# Altium footprint library HW_HOLLAND_NCDM_MONITOR_R1.PcbLib: 472 footprints (part 1 of 30)
Each footprint in its own frame and in the unit in brackets; x right, y up, seen from the top. Pads: shape width x height; smd on the part's side, far side on the other; paste and mask are expansions set on the pad; w line width, h text height; cw(c..) or ccw(c..) is an arc to the next point about the centre after c.
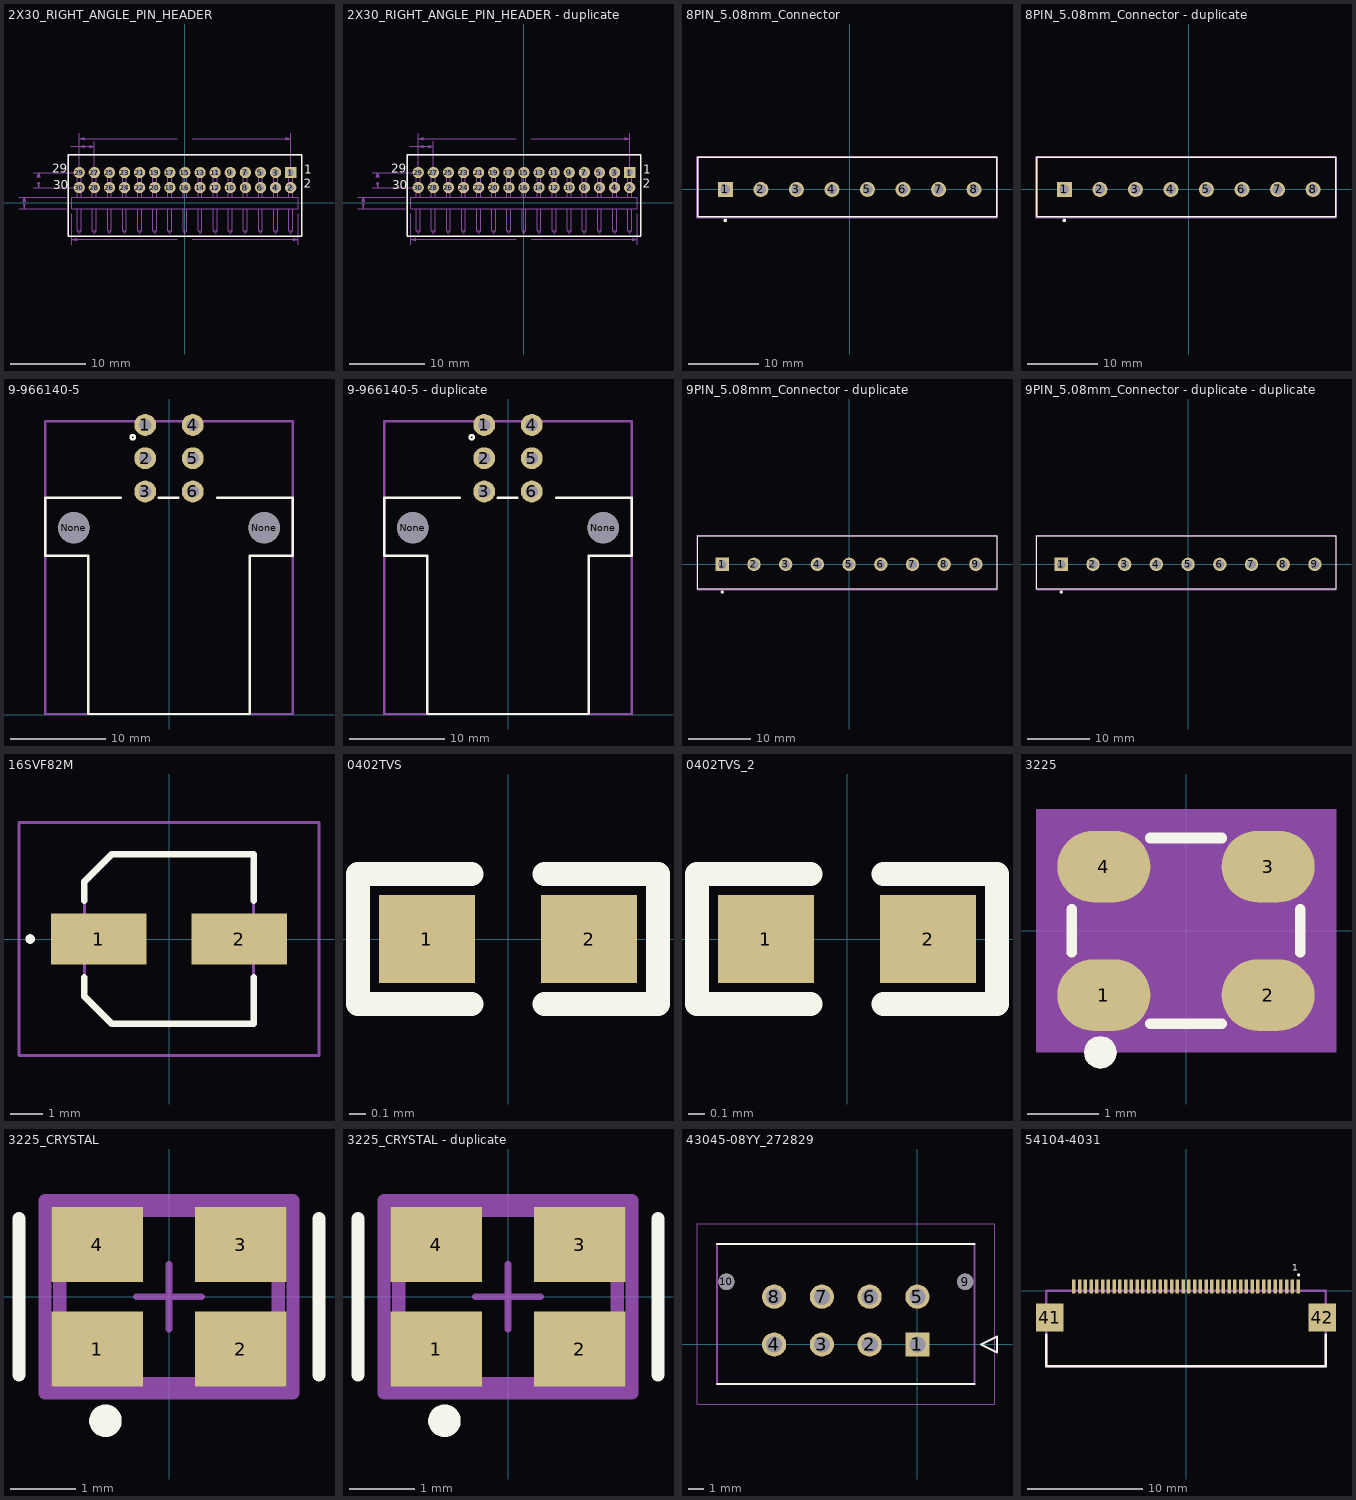
[diagram p0: the footprints below, top view; thin cyan lines are the x and y axes]

## 2X30_RIGHT_ANGLE_PIN_HEADER [mm]
pads (30):
  rect 1.49x1.49 hole 0.89: 1(14,4.019)
  round 1.49 hole 0.89: 2(14,2.019) 3(12,4.019) 4(12,2.019) 5(10,4.019) 6(10,2.019) 7(8,4.019) 8(8,2.019) 9(6,4.019) 10(6,2.019) 11(4,4.019) 12(4,2.019) 13(2,4.019) 14(2,2.019) 15(0,4.019) 16(0,2.019) 17(-2,4.019) 18(-2,2.019) 19(-4,4.019) 20(-4,2.019) 21(-6,4.019) 22(-6,2.019) 23(-8,4.019) 24(-8,2.019) 25(-10,4.019) 26(-10,2.019) 27(-12,4.019) 28(-12,2.019) 29(-14,4.019) 30(-14,2.019)
Top Overlay:
  lines w0.2: -15.45,-4.4 15.45,-4.4 15.45,6.389 -15.45,6.389 -15.45,-4.4
  text "30" at -17.468,1.399 h1.97
  text "29" at -17.568,3.599 h1.97
  text "2" at 15.73,1.584 h1.97
  text "1" at 15.78,3.484 h1.97
Top Solder:
  circle w0: c14,4.019 r0.796
  circle w0: c14,2.019 r0.796
  circle w0: c12,4.019 r0.796
  circle w0: c12,2.019 r0.796
  circle w0: c10,4.019 r0.796
  circle w0: c10,2.019 r0.796
  circle w0: c8,4.019 r0.796
  circle w0: c8,2.019 r0.796
  circle w0: c6,4.019 r0.796
  circle w0: c6,2.019 r0.796
  circle w0: c4,4.019 r0.796
  circle w0: c4,2.019 r0.796
  circle w0: c2,4.019 r0.796
  circle w0: c2,2.019 r0.796
  circle w0: c0,4.019 r0.796
  circle w0: c0,2.019 r0.796
  circle w0: c-2,4.019 r0.796
  circle w0: c-2,2.019 r0.796
  circle w0: c-4,4.019 r0.796
  circle w0: c-4,2.019 r0.796
  circle w0: c-6,4.019 r0.796
  circle w0: c-6,2.019 r0.796
  circle w0: c-8,4.019 r0.796
  circle w0: c-8,2.019 r0.796
  circle w0: c-10,4.019 r0.796
  circle w0: c-10,2.019 r0.796
  circle w0: c-12,4.019 r0.796
  circle w0: c-12,2.019 r0.796
  circle w0: c-14,4.019 r0.796
  circle w0: c-14,2.019 r0.796
Bottom Solder:
  circle w0: c14,4.019 r0.796
  circle w0: c14,2.019 r0.796
  circle w0: c12,4.019 r0.796
  circle w0: c12,2.019 r0.796
  circle w0: c10,4.019 r0.796
  circle w0: c10,2.019 r0.796
  circle w0: c8,4.019 r0.796
  circle w0: c8,2.019 r0.796
  circle w0: c6,4.019 r0.796
  circle w0: c6,2.019 r0.796
  circle w0: c4,4.019 r0.796
  circle w0: c4,2.019 r0.796
  circle w0: c2,4.019 r0.796
  circle w0: c2,2.019 r0.796
  circle w0: c0,4.019 r0.796
  circle w0: c0,2.019 r0.796
  circle w0: c-2,4.019 r0.796
  circle w0: c-2,2.019 r0.796
  circle w0: c-4,4.019 r0.796
  circle w0: c-4,2.019 r0.796
  circle w0: c-6,4.019 r0.796
  circle w0: c-6,2.019 r0.796
  circle w0: c-8,4.019 r0.796
  circle w0: c-8,2.019 r0.796
  circle w0: c-10,4.019 r0.796
  circle w0: c-10,2.019 r0.796
  circle w0: c-12,4.019 r0.796
  circle w0: c-12,2.019 r0.796
  circle w0: c-14,4.019 r0.796
  circle w0: c-14,2.019 r0.796
Mechanical 16:
  drawing of 196 lines, arcs and shapes, not listed
  text "30" at -17.468,1.399 h1.97
  text "29" at -17.568,3.599 h1.97
  text "2" at 15.73,1.584 h1.97
  text "1" at 15.78,3.484 h1.97
Mechanical 40:
  lines w0: -21.974,-0.762 -15.687,-0.762 ; -21.974,0.762 -15.687,0.762 ; -21.272,-0.318 -21.272,-0.762 ; -21.272,0.318 -21.272,0.762 ; -20.069,2.019 -14.701,2.019 ; -20.069,4.019 -14.701,4.019 ; -19.368,2.73 -19.368,2.019 ; -19.368,3.366 -19.368,4.019 ; -15.151,7.493 -14,7.493 ; -14.986,-5.527 -14.986,-1.463 ; -14,8.194 -14,4.72 -14,9.21 ; -12,4.72 -12,8.194 ; -0.991,-4.826 -14.986,-4.826 ; -0.991,8.509 -14,8.509 ; 0.991,-4.826 14.986,-4.826 ; 0.991,8.509 14,8.509 ; 14,4.72 14,9.21 ; 14.986,-5.527 14.986,-1.463 ; -21.431,-0.127 -21.352,-0.19 -21.272,-0.762 ; -21.431,-0.127 -21.272,-0.254 ; -21.431,-0.127 -21.272,-0.762 ; -21.272,-0.762 -21.272,-0.254 ; -21.272,-0.762 -21.193,-0.19 -21.272,-0.254 ; -21.272,-0.762 -21.114,-0.127 -21.272,-0.254 ; -21.272,0.254 -21.272,0.762 ; -21.272,0.254 -21.352,0.19 -21.272,0.762 ; -21.272,0.254 -21.114,0.127 ; -21.272,0.254 -21.431,0.127 -21.272,0.762 ; -21.272,0.762 -21.193,0.19 -21.114,0.127 ; -21.272,0.762 -21.114,0.127 ; -19.526,2.654 -19.447,2.591 -19.368,2.019 ; -19.526,2.654 -19.368,2.527 ; -19.526,2.654 -19.368,2.019 ; -19.368,2.019 -19.368,2.527 ; -19.368,2.019 -19.288,2.591 -19.368,2.527 ; -19.368,2.019 -19.209,2.654 -19.368,2.527 ; -19.368,3.511 -19.368,4.019 ; -19.368,3.511 -19.447,3.448 -19.368,4.019 ; -19.368,3.511 -19.209,3.384 ; -19.368,3.511 -19.526,3.384 -19.368,4.019 ; -19.368,4.019 -19.288,3.448 -19.209,3.384 ; -19.368,4.019 -19.209,3.384 ; -14.986,-4.826 -14.414,-4.747 -14.351,-4.667 ; -14.986,-4.826 -14.478,-4.826 ; -14.986,-4.826 -14.414,-4.905 -14.478,-4.826 ; -14.986,-4.826 -14.351,-4.985 -14.478,-4.826 ; -14.986,-4.826 -14.351,-4.667 ; -14.478,-4.826 -14.351,-4.667 ; -14,7.493 -12,7.493 ; -14,7.493 -13.428,7.572 -13.365,7.652 ; -14,7.493 -13.492,7.493 ; -14,7.493 -13.428,7.414 -13.492,7.493 ; -14,7.493 -13.365,7.334 -13.492,7.493 ; -14,7.493 -13.365,7.652 ; -14,8.509 -13.428,8.588 -13.365,8.668 ; -14,8.509 -13.492,8.509 ; -14,8.509 -13.428,8.43 -13.492,8.509 ; -14,8.509 -13.365,8.35 -13.492,8.509 ; -14,8.509 -13.365,8.668 ; -13.492,7.493 -13.365,7.652 ; -13.492,8.509 -13.365,8.668 ; -12.635,7.334 -12.571,7.414 -12,7.493 ; -12.635,7.334 -12.508,7.493 ; -12.635,7.334 -12,7.493 ; -12.508,7.493 -12,7.493 ; -12.508,7.493 -12.571,7.572 -12,7.493 ; -12.508,7.493 -12.635,7.652 -12,7.493 ; 13.365,8.35 13.428,8.43 14,8.509 ; 13.365,8.35 13.492,8.509 ; 13.365,8.35 14,8.509 ; 13.492,8.509 14,8.509 ; 13.492,8.509 13.428,8.588 14,8.509 ; 13.492,8.509 13.365,8.668 14,8.509 ; 14.351,-4.985 14.414,-4.905 14.986,-4.826 ; 14.351,-4.985 14.478,-4.826 ; 14.351,-4.985 14.986,-4.826 ; 14.478,-4.826 14.986,-4.826 ; 14.478,-4.826 14.414,-4.747 14.986,-4.826 ; 14.478,-4.826 14.351,-4.667 14.986,-4.826
  text "28.000" at -0.8,8.382 h0.39
  text "29.972" at -0.8,-4.953 h0.39
  text "2.000" at -16.662,7.366 h0.39
  text "2.000" at -20.028,2.921 h0.39
  text "1.524" at -21.933,-0.127 h0.39
Mechanical 42:
  lines w0.1: -15.45,-4.4 15.45,-4.4 15.45,6.389 -15.45,6.389 -15.45,-4.4
3D body "TMM-115-01-L-D-RA.stp": height 3.97, standoff -3.02, extent -15.05,-3.999 14.95,4.224

## 2X30_RIGHT_ANGLE_PIN_HEADER - duplicate [mm]
pads (30):
  rect 1.49x1.49 hole 0.89: 1(14,4.019)
  round 1.49 hole 0.89: 2(14,2.019) 3(12,4.019) 4(12,2.019) 5(10,4.019) 6(10,2.019) 7(8,4.019) 8(8,2.019) 9(6,4.019) 10(6,2.019) 11(4,4.019) 12(4,2.019) 13(2,4.019) 14(2,2.019) 15(0,4.019) 16(0,2.019) 17(-2,4.019) 18(-2,2.019) 19(-4,4.019) 20(-4,2.019) 21(-6,4.019) 22(-6,2.019) 23(-8,4.019) 24(-8,2.019) 25(-10,4.019) 26(-10,2.019) 27(-12,4.019) 28(-12,2.019) 29(-14,4.019) 30(-14,2.019)
Top Overlay:
  lines w0.2: -15.45,-4.4 -15.45,6.389 15.45,6.389 15.45,-4.4 -15.45,-4.4
  text "1" at 15.78,3.484 h1.97
  text "2" at 15.73,1.584 h1.97
  text "29" at -17.568,3.599 h1.97
  text "30" at -17.468,1.399 h1.97
Top Solder:
  circle w0: c-14,2.019 r0.796
  circle w0: c-14,4.019 r0.796
  circle w0: c-12,2.019 r0.796
  circle w0: c-12,4.019 r0.796
  circle w0: c-10,2.019 r0.796
  circle w0: c-10,4.019 r0.796
  circle w0: c-8,2.019 r0.796
  circle w0: c-8,4.019 r0.796
  circle w0: c-6,2.019 r0.796
  circle w0: c-6,4.019 r0.796
  circle w0: c-4,2.019 r0.796
  circle w0: c-4,4.019 r0.796
  circle w0: c-2,2.019 r0.796
  circle w0: c-2,4.019 r0.796
  circle w0: c0,2.019 r0.796
  circle w0: c0,4.019 r0.796
  circle w0: c2,2.019 r0.796
  circle w0: c2,4.019 r0.796
  circle w0: c4,2.019 r0.796
  circle w0: c4,4.019 r0.796
  circle w0: c6,2.019 r0.796
  circle w0: c6,4.019 r0.796
  circle w0: c8,2.019 r0.796
  circle w0: c8,4.019 r0.796
  circle w0: c10,2.019 r0.796
  circle w0: c10,4.019 r0.796
  circle w0: c12,2.019 r0.796
  circle w0: c12,4.019 r0.796
  circle w0: c14,2.019 r0.796
  circle w0: c14,4.019 r0.796
Bottom Solder:
  circle w0: c-14,2.019 r0.796
  circle w0: c-14,4.019 r0.796
  circle w0: c-12,2.019 r0.796
  circle w0: c-12,4.019 r0.796
  circle w0: c-10,2.019 r0.796
  circle w0: c-10,4.019 r0.796
  circle w0: c-8,2.019 r0.796
  circle w0: c-8,4.019 r0.796
  circle w0: c-6,2.019 r0.796
  circle w0: c-6,4.019 r0.796
  circle w0: c-4,2.019 r0.796
  circle w0: c-4,4.019 r0.796
  circle w0: c-2,2.019 r0.796
  circle w0: c-2,4.019 r0.796
  circle w0: c0,2.019 r0.796
  circle w0: c0,4.019 r0.796
  circle w0: c2,2.019 r0.796
  circle w0: c2,4.019 r0.796
  circle w0: c4,2.019 r0.796
  circle w0: c4,4.019 r0.796
  circle w0: c6,2.019 r0.796
  circle w0: c6,4.019 r0.796
  circle w0: c8,2.019 r0.796
  circle w0: c8,4.019 r0.796
  circle w0: c10,2.019 r0.796
  circle w0: c10,4.019 r0.796
  circle w0: c12,2.019 r0.796
  circle w0: c12,4.019 r0.796
  circle w0: c14,2.019 r0.796
  circle w0: c14,4.019 r0.796
Mechanical 16:
  drawing of 196 lines, arcs and shapes, not listed
  text "1" at 15.78,3.484 h1.97
  text "2" at 15.73,1.584 h1.97
  text "29" at -17.568,3.599 h1.97
  text "30" at -17.468,1.399 h1.97
Mechanical 40:
  lines w0: -21.974,-0.762 -15.687,-0.762 ; -21.974,0.762 -15.687,0.762 ; -21.272,-0.318 -21.272,-0.762 ; -21.272,0.318 -21.272,0.762 ; -20.069,2.019 -14.701,2.019 ; -20.069,4.019 -14.701,4.019 ; -19.368,2.73 -19.368,2.019 ; -19.368,3.366 -19.368,4.019 ; -15.151,7.493 -14,7.493 ; -14.986,-5.527 -14.986,-1.463 ; -14,8.194 -14,4.72 -14,9.21 ; -12,4.72 -12,8.194 ; -0.991,-4.826 -14.986,-4.826 ; -0.991,8.509 -14,8.509 ; 0.991,-4.826 14.986,-4.826 ; 0.991,8.509 14,8.509 ; 14,4.72 14,9.21 ; 14.986,-5.527 14.986,-1.463 ; -21.431,-0.127 -21.272,-0.762 ; -21.431,-0.127 -21.272,-0.254 ; -21.431,-0.127 -21.352,-0.19 -21.272,-0.762 ; -21.272,-0.762 -21.114,-0.127 -21.272,-0.254 ; -21.272,-0.762 -21.193,-0.19 -21.272,-0.254 ; -21.272,-0.762 -21.272,-0.254 ; -21.272,0.254 -21.431,0.127 -21.272,0.762 ; -21.272,0.254 -21.114,0.127 ; -21.272,0.254 -21.352,0.19 -21.272,0.762 ; -21.272,0.254 -21.272,0.762 ; -21.272,0.762 -21.114,0.127 ; -21.272,0.762 -21.193,0.19 -21.114,0.127 ; -19.526,2.654 -19.368,2.019 ; -19.526,2.654 -19.368,2.527 ; -19.526,2.654 -19.447,2.591 -19.368,2.019 ; -19.368,2.019 -19.209,2.654 -19.368,2.527 ; -19.368,2.019 -19.288,2.591 -19.368,2.527 ; -19.368,2.019 -19.368,2.527 ; -19.368,3.511 -19.526,3.384 -19.368,4.019 ; -19.368,3.511 -19.209,3.384 ; -19.368,3.511 -19.447,3.448 -19.368,4.019 ; -19.368,3.511 -19.368,4.019 ; -19.368,4.019 -19.209,3.384 ; -19.368,4.019 -19.288,3.448 -19.209,3.384 ; -14.986,-4.826 -14.351,-4.667 ; -14.986,-4.826 -14.351,-4.985 -14.478,-4.826 ; -14.986,-4.826 -14.414,-4.905 -14.478,-4.826 ; -14.986,-4.826 -14.478,-4.826 ; -14.986,-4.826 -14.414,-4.747 -14.351,-4.667 ; -14.478,-4.826 -14.351,-4.667 ; -14,7.493 -13.365,7.652 ; -14,7.493 -13.365,7.334 -13.492,7.493 ; -14,7.493 -13.428,7.414 -13.492,7.493 ; -14,7.493 -13.492,7.493 ; -14,7.493 -13.428,7.572 -13.365,7.652 ; -14,7.493 -12,7.493 ; -14,8.509 -13.365,8.668 ; -14,8.509 -13.365,8.35 -13.492,8.509 ; -14,8.509 -13.428,8.43 -13.492,8.509 ; -14,8.509 -13.492,8.509 ; -14,8.509 -13.428,8.588 -13.365,8.668 ; -13.492,7.493 -13.365,7.652 ; -13.492,8.509 -13.365,8.668 ; -12.635,7.334 -12,7.493 ; -12.635,7.334 -12.508,7.493 ; -12.635,7.334 -12.571,7.414 -12,7.493 ; -12.508,7.493 -12.635,7.652 -12,7.493 ; -12.508,7.493 -12.571,7.572 -12,7.493 ; -12.508,7.493 -12,7.493 ; 13.365,8.35 14,8.509 ; 13.365,8.35 13.492,8.509 ; 13.365,8.35 13.428,8.43 14,8.509 ; 13.492,8.509 13.365,8.668 14,8.509 ; 13.492,8.509 13.428,8.588 14,8.509 ; 13.492,8.509 14,8.509 ; 14.351,-4.985 14.986,-4.826 ; 14.351,-4.985 14.478,-4.826 ; 14.351,-4.985 14.414,-4.905 14.986,-4.826 ; 14.478,-4.826 14.351,-4.667 14.986,-4.826 ; 14.478,-4.826 14.414,-4.747 14.986,-4.826 ; 14.478,-4.826 14.986,-4.826
  text "1.524" at -21.933,-0.127 h0.39
  text "2.000" at -20.028,2.921 h0.39
  text "2.000" at -16.662,7.366 h0.39
  text "29.972" at -0.8,-4.953 h0.39
  text "28.000" at -0.8,8.382 h0.39
Mechanical 42:
  lines w0.1: -15.45,-4.4 -15.45,6.389 15.45,6.389 15.45,-4.4 -15.45,-4.4
3D body "TMM-115-01-L-D-RA.stp": height 3.97, standoff -3.02, extent -15.05,-3.999 14.95,4.224

## 8PIN_5.08mm_Connector [mm]
pads (8):
  rect 2.15x2.15 hole 1.4 paste-2539.97 mask+0: 1(-17.78,0)
  round 2.15 hole 1.4 paste-2539.97 mask+0: 2(-12.7,0) 3(-7.62,0) 4(-2.54,0) 5(2.54,0) 6(7.62,0) 7(12.7,0) 8(17.78,0)
Top Overlay:
  circle w0.25: c-17.78,-4.425 r0.125
  lines w0.2: -21.73,-3.925 -21.73,4.575 21.035,4.575 21.035,-3.925 -21.73,-3.925
Top Courtyard:
  lines w0.2: -21.83,-4.025 -21.83,4.675 21.035,4.675 21.035,-4.025 -21.83,-4.025
  text ".Designator" at 0.125,1.854 h1
Mechanical 12:
  lines w0.2: -21.73,-3.925 -21.73,4.575 21.035,4.575 21.035,-3.925 -21.73,-3.925
Mechanical 15:
  lines w0.1: -13.45,0.325 -12.45,0.325 ; -12.95,-0.175 -12.95,0.825
  lines w0.2: -21.83,-4.025 -21.83,4.675 21.059,4.675 21.059,-4.025 -21.83,-4.025
3D body "c-796636-8-b-3d.stp": height 12.17, standoff -3.33, extent -21.535,-3.8 20.925,4.55

## 8PIN_5.08mm_Connector - duplicate [mm]
pads (8):
  rect 2.15x2.15 hole 1.4 paste-2539.97 mask+0: 1(-17.78,0)
  round 2.15 hole 1.4 paste-2539.97 mask+0: 2(-12.7,0) 3(-7.62,0) 4(-2.54,0) 5(2.54,0) 6(7.62,0) 7(12.7,0) 8(17.78,0)
Top Overlay:
  circle w0.25: c-17.78,-4.425 r0.125
  lines w0.2: -21.73,-3.925 21.035,-3.925 21.035,4.575 -21.73,4.575 -21.73,-3.925
Top Courtyard:
  lines w0.2: -21.83,-4.025 21.035,-4.025 21.035,4.675 -21.83,4.675 -21.83,-4.025
  text ".Designator" at 0.125,1.854 h1
Mechanical 12:
  lines w0.2: -21.73,-3.925 21.035,-3.925 21.035,4.575 -21.73,4.575 -21.73,-3.925
Mechanical 15:
  lines w0.1: -13.45,0.325 -12.45,0.325 ; -12.95,-0.175 -12.95,0.825
  lines w0.2: -21.83,-4.025 21.059,-4.025 21.059,4.675 -21.83,4.675 -21.83,-4.025
3D body "c-796636-8-b-3d.stp": height 12.17, standoff -3.33, extent -21.535,-3.8 20.925,4.55

## 9-966140-5 [mm]
height 0.52
pads (8):
  round 2.3 hole 1.3 mask+0.05: 1(-2.5,30.5) 2(-2.5,27) 3(-2.5,23.5) 4(2.5,30.5) 5(2.5,27) 6(2.5,23.5)
  round 3.3 hole 3.3 unplated: None(-10,19.7) None(10,19.7)
Top Overlay:
  circle w0.254: c-3.81,29.21 r0.224
  lines w0.254: -5.08,22.85 -13,22.85 -13,16.75 -8.5,16.75 -8.5,0.1 8.5,0.1 8.5,16.75 13,16.75 13,22.85 5.08,22.85 ; -1.1,22.85 1,22.85
Top Designator:
  lines w0.254: -13,0.1 -13,30.9 13,30.9 13,0.1 -13,0.1
  text ".Designator" at -19.994,13.667 h4
3D body "c-9-966140-5-f-3d.stp": height 25.85, standoff -2.85, extent -12.95,0 12.9,30.9

## 9-966140-5 - duplicate [mm]
height 0.52
pads (8):
  round 2.3 hole 1.3 mask+0.05: 1(-2.5,30.5) 2(-2.5,27) 3(-2.5,23.5) 4(2.5,30.5) 5(2.5,27) 6(2.5,23.5)
  round 3.3 hole 3.3 unplated: None(-10,19.7) None(10,19.7)
Top Overlay:
  circle w0.254: c-3.81,29.21 r0.224
  lines w0.254: -5.08,22.85 -13,22.85 -13,16.75 -8.5,16.75 -8.5,0.1 8.5,0.1 8.5,16.75 13,16.75 13,22.85 5.08,22.85 ; -1.1,22.85 1,22.85
Top Designator:
  lines w0.254: -13,0.1 13,0.1 13,30.9 -13,30.9 -13,0.1
  text ".Designator" at -19.994,13.667 h4
3D body "c-9-966140-5-f-3d.stp": height 25.85, standoff -2.85, extent -12.95,0 12.9,30.9

## 9PIN_5.08mm_Connector - duplicate [mm]
pads (9):
  rect 2.15x2.15 hole 1.4 paste-2539.97 mask+0: 1(-20.32,0)
  round 2.15 hole 1.4 paste-2539.97 mask+0: 2(-15.24,0) 3(-10.16,0) 4(-5.08,0) 5(0,0) 6(5.08,0) 7(10.16,0) 8(15.24,0) 9(20.32,0)
Top Overlay:
  circle w0.25: c-20.32,-4.425 r0.125
  lines w0.2: -24.27,-3.925 23.7,-3.925 23.7,4.575 -24.27,4.575 -24.27,-3.925
Top Courtyard:
  lines w0.2: -24.37,-4.025 23.7,-4.025 23.7,4.675 -24.37,4.675 -24.37,-4.025
  text ".Designator" at -2.415,1.854 h1
Mechanical 12:
  lines w0.2: -24.27,-3.925 23.7,-3.925 23.7,4.575 -24.27,4.575 -24.27,-3.925
Mechanical 15:
  lines w0.1: -15.99,0.325 -14.99,0.325 ; -15.49,-0.175 -15.49,0.825
  lines w0.2: -24.37,-4.025 23.7,-4.025 23.7,4.675 -24.37,4.675 -24.37,-4.025
3D body "c-796636-9-b-3d.stp": height 12.17, standoff -3.33, extent -23.973,-3.8 23.567,4.55

## 9PIN_5.08mm_Connector - duplicate - duplicate [mm]
pads (9):
  rect 2.15x2.15 hole 1.4 paste-2539.97 mask+0: 1(-20.32,0)
  round 2.15 hole 1.4 paste-2539.97 mask+0: 2(-15.24,0) 3(-10.16,0) 4(-5.08,0) 5(0,0) 6(5.08,0) 7(10.16,0) 8(15.24,0) 9(20.32,0)
Top Overlay:
  circle w0.25: c-20.32,-4.425 r0.125
  lines w0.2: -24.27,-3.925 23.7,-3.925 23.7,4.575 -24.27,4.575 -24.27,-3.925
Top Courtyard:
  lines w0.2: -24.37,-4.025 23.7,-4.025 23.7,4.675 -24.37,4.675 -24.37,-4.025
  text ".Designator" at -2.415,1.854 h1
Mechanical 12:
  lines w0.2: -24.27,-3.925 23.7,-3.925 23.7,4.575 -24.27,4.575 -24.27,-3.925
Mechanical 15:
  lines w0.1: -15.99,0.325 -14.99,0.325 ; -15.49,-0.175 -15.49,0.825
  lines w0.2: -24.37,-4.025 23.7,-4.025 23.7,4.675 -24.37,4.675 -24.37,-4.025
3D body "c-796636-9-b-3d.stp": height 12.17, standoff -3.33, extent -23.973,-3.8 23.567,4.55

## 16SVF82M [mm]
pads (2):
  rect 3x1.6 smd: 1(-2.2,0) 2(2.2,0)
Top Overlay:
  lines w0.2: -2.65,-1.2 -2.65,-1.8 -1.8,-2.65 2.65,-2.65 2.65,-1.2 ; -2.65,1.2 -2.65,1.8 -1.8,2.65 2.65,2.65 2.65,1.2 ; -4.4,0 cw(c-4.35,0) -4.3,0 ; -4.4,0 ccw(c-4.35,0) -4.3,0 ; -4.4,0 cw(c-4.35,0) -4.3,0
Mechanical 13:
  lines w0.1: -2.65,-1.8 -1.8,-2.65 2.65,-2.65 2.65,2.65 -1.8,2.65 -2.65,1.8 -2.65,1.2 -2.65,-1.8
Mechanical 15:
  lines w0.1: -4.7,-3.65 4.7,-3.65 4.7,3.65 -4.7,3.65 -4.7,-3.65
3D body "6SVPC120MV.stp": height 0.43, standoff 0.43, extent 0,0 0,0
3D body "6SVPC120MV.STEP": height 5.91, standoff 0.01, extent -3,-2.65 3,2.65

## 0402TVS [mm]
height 3.5
pads (2):
  rect 0.6x0.55 smd: 1(-0.508,0) 2(0.508,0)
Top Overlay:
  lines w0.15: -0.229,-0.406 -0.94,-0.406 -0.94,0.406 -0.229,0.406 ; 0.229,-0.406 0.94,-0.406 0.94,0.406 0.229,0.406
3D body "User Library-RES_1005-0402.step": height 0.41, standoff 0, extent -0.575,-0.275 0.575,0.275

## 0402TVS_2 [mm]
pads (2):
  rect 0.6x0.55 smd: 1(-0.508,0) 2(0.508,0)
Top Overlay:
  lines w0.15: -0.229,-0.406 -0.94,-0.406 -0.94,0.406 -0.229,0.406 ; 0.229,-0.406 0.94,-0.406 0.94,0.406 0.229,0.406
3D body "User Library-RES_1005-0402.step": height 0.41, standoff 0, extent -0.575,-0.275 0.575,0.275

## 3225 [mm]
pads (4):
  oval 1.3x1 smd: 1(-1.15,-0.9) 2(1.15,-0.9) 3(1.15,0.9) 4(-1.15,0.9)
Top Overlay:
  dashed: -1.2,-1.472 -1.287,-1.489 -1.361,-1.539 -1.411,-1.613 -1.428,-1.7 -1.411,-1.787 -1.394,-1.812 -1.361,-1.861 -1.287,-1.911 -1.2,-1.928 -1.113,-1.911 -1.039,-1.861 -1.006,-1.812 -0.989,-1.787 -0.972,-1.7 -0.989,-1.613 -1.039,-1.539 -1.113,-1.489
  lines w0.152: -1.6,-0.3 -1.6,0.3 ; -0.5,-1.3 0.5,-1.3 ; -0.5,1.3 0.5,1.3 ; 1.6,-0.3 1.6,0.3
Top Assembly:
  dashed: -1.2,-1.472 -1.287,-1.489 -1.361,-1.539 -1.411,-1.613 -1.428,-1.7 -1.411,-1.787 -1.394,-1.812 -1.361,-1.861 -1.287,-1.911 -1.2,-1.928 -1.113,-1.911 -1.039,-1.861 -1.006,-1.812 -0.989,-1.787 -0.972,-1.7 -0.989,-1.613 -1.039,-1.539 -1.113,-1.489
  lines w0.025: -0.2,1.3 1.6,1.3 1.6,-1.3 -1.6,-1.3 -1.6,1.3 -0.1,1.3
  text ".Designator" at 0.635,0.212 h0.64
Top 3D Body:
  region: -2.1,1.7 2.1,1.7 2.1,-1.7 -2.1,-1.7
Mechanical 17:
  text "4" at -1.15,0.9 h0.91
  text "2" at 1.15,-0.9 h0.91
  text "3" at 1.15,0.9 h0.91
  text "1" at -1.15,-0.9 h0.91
3D body: height 3.81, standoff 0, extent -2.1,-1.7 2.1,1.7

## 3225_CRYSTAL [mm]
pads (4):
  rect 1.4x1.15 smd paste+0 mask+0: 1(-1.1,-0.8) 2(1.1,-0.8) 3(1.1,0.8) 4(-1.1,0.8)
Top Overlay:
  circle w0.25: c-0.975,-1.9 r0.125
  lines w0.2: -2.3,-1.2 -2.3,1.2 ; 2.3,-1.2 2.3,1.2
Top Courtyard:
  lines w0.2: -1.9,-1.475 1.9,-1.475 1.9,1.475 -1.9,1.475 -1.9,-1.475
  text ".Designator" at 0,0.188 h1
Mechanical 12:
  lines w0.2: -1.675,-1.325 1.675,-1.325 1.675,1.325 -1.675,1.325 -1.675,-1.325
Mechanical 15:
  lines w0.1: -0.5,0 0.5,0 ; 0,-0.5 0,0.5
  lines w0.2: -1.9,-1.475 1.9,-1.475 1.9,1.475 -1.9,1.475 -1.9,-1.475
3D body "Crys_Epson_TSX-3225_25_0000MF10P-C0_eec.STEP": height 0.6, standoff 0, extent -1.6,-1.25 1.6,1.25

## 3225_CRYSTAL - duplicate [mm]
pads (4):
  rect 1.4x1.15 smd paste+0 mask+0: 1(-1.1,-0.8) 2(1.1,-0.8) 3(1.1,0.8) 4(-1.1,0.8)
Top Overlay:
  circle w0.25: c-0.975,-1.9 r0.125
  lines w0.2: -2.3,-1.2 -2.3,1.2 ; 2.3,-1.2 2.3,1.2
Top Courtyard:
  lines w0.2: -1.9,-1.475 1.9,-1.475 1.9,1.475 -1.9,1.475 -1.9,-1.475
  text ".Designator" at 0,0.188 h1
Mechanical 12:
  lines w0.2: -1.675,-1.325 1.675,-1.325 1.675,1.325 -1.675,1.325 -1.675,-1.325
Mechanical 15:
  lines w0.1: -0.5,0 0.5,0 ; 0,-0.5 0,0.5
  lines w0.2: -1.9,-1.475 1.9,-1.475 1.9,1.475 -1.9,1.475 -1.9,-1.475
3D body "Crys_Epson_TSX-3225_25_0000MF10P-C0_eec.STEP": height 0.6, standoff 0, extent -1.6,-1.25 1.6,1.25

## 43045-08YY_272829 [mm]
pads (10):
  rect 1.52x1.52 / inner round 1.52 / far side rect 1.52x1.52 hole 1.02 mask+0.076: 1(0,0)
  round 1.52 hole 1.02 mask+0.076: 2(-3,0) 3(-6,0) 4(-9,0) 5(0,3) 6(-3,3) 7(-6,3) 8(-9,3)
  round 1.02 hole 1.02 unplated mask+0.076: 9(3,3.94) 10(-12,3.94)
Top Overlay:
  lines w0.127: -12.575,-2.47 3.575,-2.47 ; -12.575,6.3 3.575,6.3 ; 4,0 5,-0.5 5,0.5 4,0
Mechanical 15:
  lines w0.127: -12.575,-2.47 3.575,-2.47 3.575,6.3 -12.575,6.3 -12.575,-2.47 ; 4,0 5,-0.5 5,0.5 4,0
Mechanical 20:
  lines w0.05: -13.845,-3.74 4.845,-3.74 4.845,7.57 -13.845,7.57 -13.845,-3.74
3D body "43045-0827.stp": height 5.8, standoff -4.65, extent -10,-3.376 10,3.376

## 54104-4031 [mm]
pads (42):
  rect 0.3x1.2 smd: 1(9.75,0.382) 2(9.25,0.382) 3(8.75,0.382) 4(8.25,0.382) 5(7.75,0.382) 6(7.25,0.382) 7(6.75,0.382) 8(6.25,0.382) 9(5.75,0.382) 10(5.25,0.382) 11(4.75,0.382) 12(4.25,0.382) 13(3.75,0.382) 14(3.25,0.382) 15(2.75,0.382) 16(2.25,0.382) 17(1.75,0.382) 18(1.25,0.382) 19(0.75,0.382) 20(0.25,0.382) 21(-0.25,0.382) 22(-0.75,0.382) 23(-1.25,0.382) 24(-1.75,0.382) 25(-2.25,0.382) 26(-2.75,0.382) 27(-3.25,0.382) 28(-3.75,0.382) 29(-4.25,0.382) 30(-4.75,0.382) 31(-5.25,0.382) 32(-5.75,0.382) 33(-6.25,0.382) 34(-6.75,0.382) 35(-7.25,0.382) 36(-7.75,0.382) 37(-8.25,0.382) 38(-8.75,0.382) 39(-9.25,0.382) 40(-9.75,0.382)
  rect 2.4x2.4 smd: 41(-11.85,-2.318) 42(11.85,-2.318)
Top Overlay:
  circle w0.2: c9.8,1.4 r0.027
  lines w0.2: -12.15,-3.814 -12.15,-6.55 12.15,-6.55 12.15,-3.814
  text "1" at 9.263,1.528 h1
Mechanical 13:
  lines w0.2: -12.15,-6.55 -12.15,0 12.15,0 12.15,-6.55 -12.15,-6.55
3D body "54104-4031.stp": height 2.05, standoff 0, extent -12.75,-4.81 12.75,0.79